# Altium footprint library My Library.PcbLib: 872 footprints (part 35 of 55)
Each footprint in its own frame and in the unit in brackets; x right, y up, seen from the top. Pads: shape width x height; smd on the part's side, far side on the other; paste and mask are expansions set on the pad; w line width, h text height; cw(c..) or ccw(c..) is an arc to the next point about the centre after c.
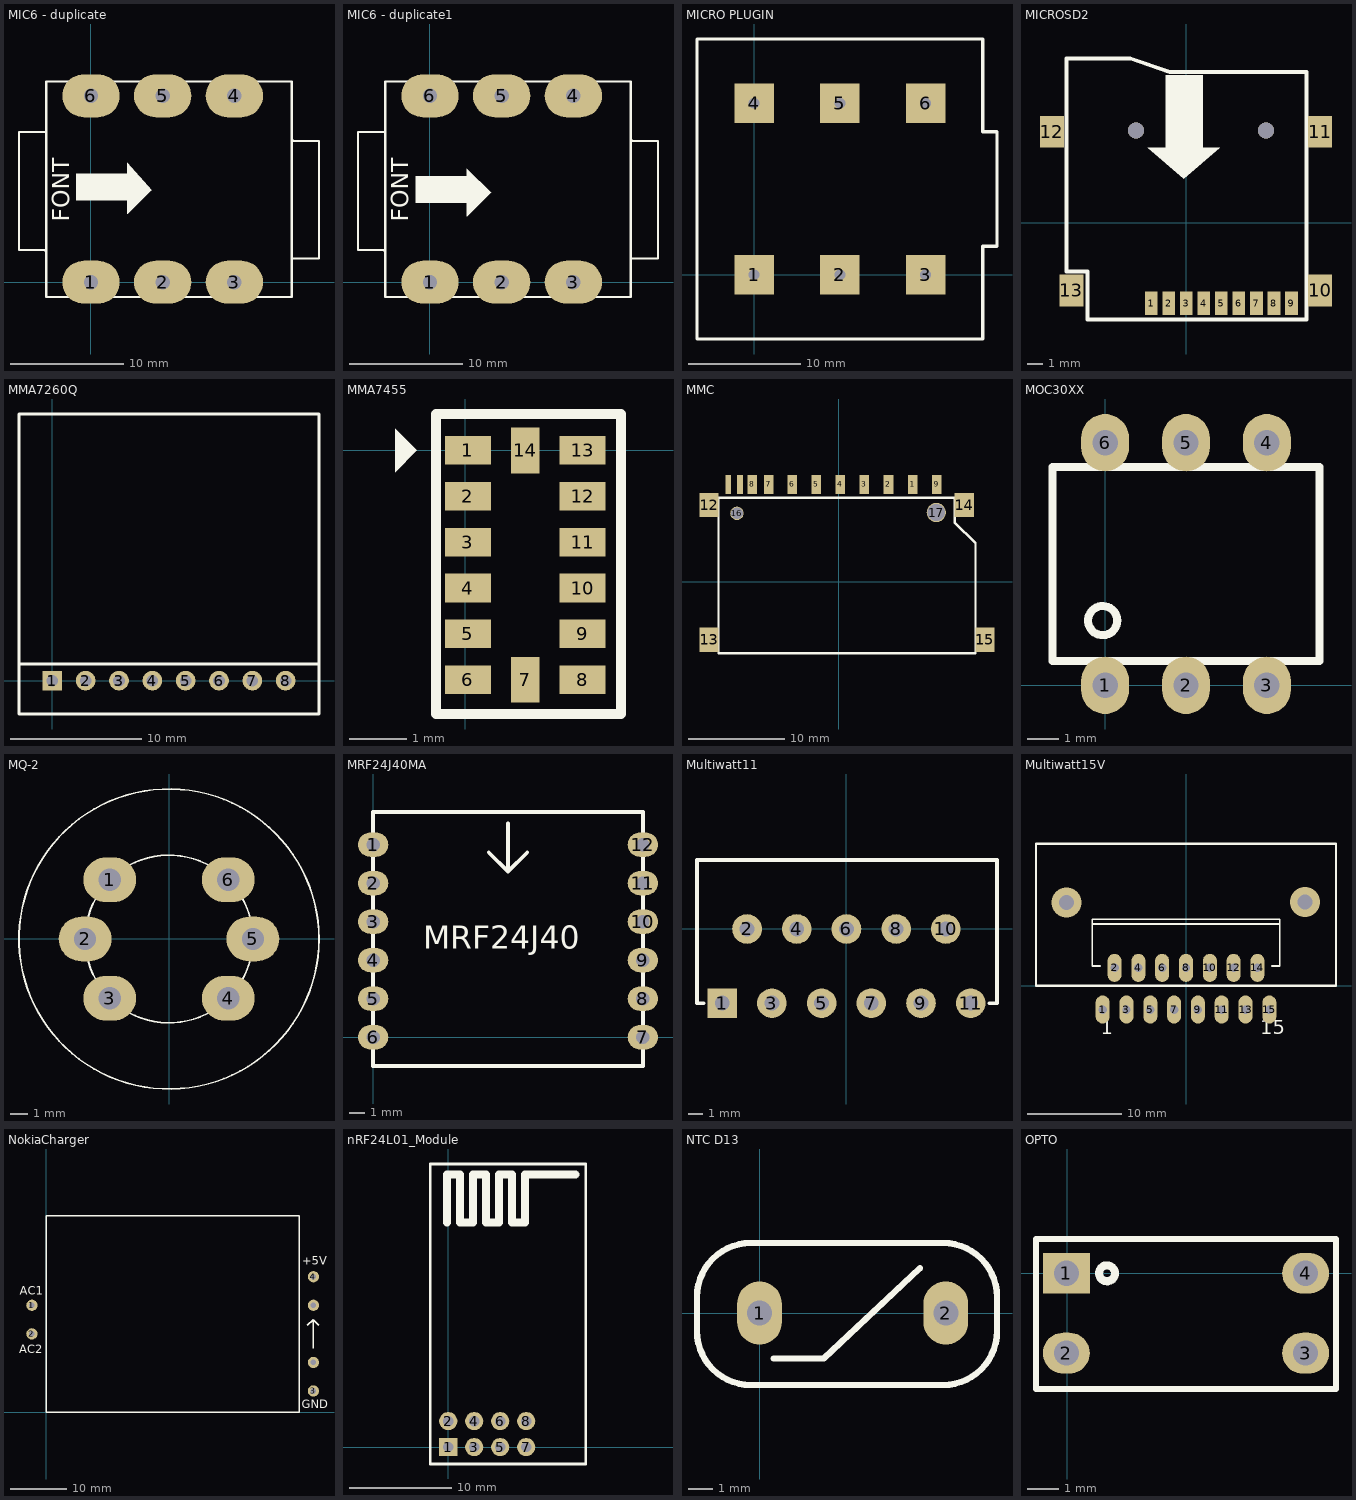
[diagram p34: the footprints below, top view; thin cyan lines are the x and y axes]

## MIC6 - duplicate [mm] "Jac Mic 6 pin to"
pads (6):
  oval 5.08x3.81 hole 1.27: 1(0,0) 2(6.35,0) 3(12.7,0) 4(12.7,16.51) 5(6.35,16.51) 6(0,16.51)
Top Overlay:
  region: -1.321,9.601 -1.321,7.264 3.251,7.264 3.226,7.29 3.226,6.071 3.251,6.071 5.334,8.153 5.359,8.153 3.226,10.592 3.226,9.601
  lines w0.178: -3.962,-1.295 -3.962,17.755 ; -3.962,2.261 -3.962,13.335 -4.013,13.284 -6.375,13.284 -6.375,2.845 -4.115,2.845 -3.962,2.692 ; -3.962,17.78 17.78,17.78 17.78,14.986 ; -3.937,-1.321 -3.912,-1.295 -3.886,-1.321 17.78,-1.321 17.78,2.083 ; 17.78,12.675 17.932,12.522 20.193,12.522 20.193,2.083 17.831,2.083 17.78,2.032 17.78,15.088
  text "FONT" at -1.905,5.334 h1.52

## MIC6 - duplicate1 [mm] "Jac Mic 6 pin to"
pads (6):
  oval 5.08x3.81 hole 1.27: 1(0,0) 2(6.35,0) 3(12.7,0) 4(12.7,16.51) 5(6.35,16.51) 6(0,16.51)
Top Overlay:
  region: -1.27,9.373 -1.27,7.036 3.302,7.036 3.277,7.061 3.277,5.842 3.302,5.842 5.385,7.925 5.41,7.925 3.277,10.058 3.277,9.373
  lines w0.178: -3.962,-1.295 -3.962,17.755 ; -3.962,2.261 -3.962,13.335 -4.013,13.284 -6.375,13.284 -6.375,2.845 -4.115,2.845 -3.962,2.692 ; -3.962,17.78 17.78,17.78 17.78,14.986 ; -3.937,-1.321 -3.912,-1.295 -3.886,-1.321 17.78,-1.321 17.78,2.083 ; 17.78,12.675 17.932,12.522 20.193,12.522 20.193,2.083 17.831,2.083 17.78,2.032 17.78,15.088
  text "FONT" at -1.905,5.334 h1.52

## MICRO PLUGIN [mil]
pads (6):
  rect 137.8x137.8 / inner round 62 / far side rect 137.8x137.8 hole 38: 1(0,0) 2(300,0) 3(600,0) 4(0,600) 5(300,600) 6(600,600)
Top Overlay:
  lines w11.82: -200,-225 800,-225 800,100 850,100 850,500 800,500 800,825 -200,825 -200,-225

## MICROSD2 [mm]
pads (13):
  rect 0.8x1.5 smd: 1(-2.184,-5.039) 2(-1.084,-5.039) 3(0.016,-5.039) 4(1.116,-5.039) 5(2.216,-5.039) 6(3.316,-5.039) 7(4.416,-5.039) 8(5.516,-5.039) 9(6.616,-5.039)
  rect 1.5x2 smd: 10(8.407,-4.235) 11(8.407,5.715) 12(-8.407,5.715) 13(-7.188,-4.235)
via -3.15,5.791 diameter 1 hole 1
via 5.004,5.791 diameter 1 hole 1
Top Overlay:
  region: 1.041,9.246 -1.27,9.246 -1.27,4.674 -1.245,4.699 -2.413,4.699 -0.127,2.769 2.108,4.699 1.041,4.699
  lines w0.254: -7.493,-3.035 -7.493,10.325 -3.52,10.325 -1.016,9.461 7.544,9.461 7.544,-6.071 -6.172,-6.071 -6.172,-3.035 -7.493,-3.035
3D body: height 1.85, standoff 0, extent -7.493,-4.559 7.544,10.325
3D body "User Library-microsd card.step": height 1.2, standoff 0.2, extent -5.43,-2.376 5.582,12.624

## MMA7260Q [mm] "Connector; Header; 8 Position"
pads (8):
  rect 1.5x1.5 hole 0.9: 1(0,0)
  round 1.5 hole 0.9: 2(2.54,0) 3(5.08,0) 4(7.62,0) 5(10.16,0) 6(12.7,0) 7(15.24,0) 8(17.78,0)
Top Overlay:
  lines w0.2: -2.54,1.27 20.32,1.27 ; -2.54,-2.54 -2.54,20.32 20.32,20.32 20.32,-2.54 -2.54,-2.54
3D body: height 2, standoff 1, extent 7.62,7.62 13.97,13.97
3D body: height 1, standoff 0, extent -2.54,-2.54 20.32,20.32

## MMA7455 [mm]
pads (14):
  rect 0.8x0.5 smd: 1(0.051,0) 2(0.051,-0.8) 3(0.051,-1.6) 4(0.051,-2.4) 5(0.051,-3.2) 6(0.051,-4) 8(2.051,-4) 9(2.051,-3.2) 10(2.051,-2.4) 11(2.051,-1.6) 12(2.051,-0.8) 13(2.051,0)
  rect 0.5x0.8 smd: 7(1.051,-4) 14(1.051,0)
Top Overlay:
  region: -1.219,0.381 -0.838,0 -1.219,-0.381
  lines w0.178: -0.508,-4.572 -0.508,0.635 2.718,0.635 2.718,-4.597 ; 2.718,-4.597 -0.508,-4.597 2.718,-4.597

## MMC [mm]
pads (17):
  rect 1x2 smd: 1(7.67,10.109) 2(5.17,10.109) 3(2.67,10.109) 4(0.17,10.109) 5(-2.33,10.109) 6(-4.83,10.109) 7(-7.255,10.109) 8(-8.955,10.109) 9(10.17,10.109)
  rect 0.6x2 smd: 10(-10.255,10.109) 11(-11.455,10.109)
  rect 2x2.5 smd: 12(-13.455,7.95) 13(-13.455,-6.02) 14(13.024,7.95) 15(15.183,-6.02)
  round 1.4 hole 1.2: 16(-10.555,7.109)
  round 2 hole 1.8: 17(10.135,7.188)
Top Overlay:
  lines w0.254: -12.471,-7.417 -12.471,8.712 12.04,8.712 12.04,6.172 14.199,4.013 14.199,-7.417 -12.471,-7.417
3D body "User Library-SD Kart.step": height 3, standoff -1, extent -13.436,-20.196 15.164,9.804

## MOC30XX [mm]
pads (6):
  oval 1.5x1.8 hole 0.8: 1(0,0) 2(2.54,0) 3(5.08,0) 4(5.08,7.62) 5(2.54,7.62) 6(0,7.62)
Top Overlay:
  circle w0.254: c-0.077,2.032 r0.458
  lines w0.254: -1.651,0.762 -1.651,6.858 6.731,6.858 6.731,0.762 -1.651,0.762
3D body "SW3DPS-DIP6-DEFAULT.step": height 4.41, standoff -3.18, extent -1.5,-0.19 6.58,7.81

## MQ-2 [mm] "MQ-2 GAS SENSOR"
height 20.32
pads (6):
  oval 3x2.54 hole 1.25: 1(-3.359,3.359) 2(-4.75,0) 3(-3.359,-3.359) 4(3.359,-3.359) 5(4.75,0) 6(3.359,3.359)
Top Overlay:
  circle w0.1: c0,0 r8.5
  circle w0.1: c0,0 r4.75
3D body: height 8.7, standoff 0.5, extent -4.762,-4.791 4.8,4.791
3D body: height 16.7, standoff 0.2, extent -4.713,-4.741 4.75,4.74
3D body: height 6.3, standoff 0.1, extent -8.433,-8.483 8.5,8.483
3D body: height 0.4, standoff -2.3, extent -3.855,2.86 -2.859,3.858
3D body: height 0.4, standoff -2.3, extent -5.258,-0.499 -4.262,0.499
3D body: height 0.4, standoff -2.3, extent -3.855,-3.858 -2.859,-2.86
3D body: height 0.4, standoff -2.3, extent 2.863,-3.858 3.859,-2.86
3D body: height 0.4, standoff -2.3, extent 4.254,-0.499 5.25,0.499
3D body: height 0.4, standoff -2.3, extent 2.863,2.86 3.859,3.858

## MRF24J40MA [mm] "Microchip Zigbee Module"
pads (12):
  oval 2x1.6 hole 0.9: 1(0,12.7) 2(0,10.16) 3(0,7.62) 4(0,5.08) 5(0,2.54) 6(0,0) 7(17.78,0) 8(17.78,2.54) 9(17.78,5.08) 10(17.78,7.62) 11(17.78,10.16) 12(17.78,12.7)
Top Overlay:
  lines w0.254: 0,8.255 0,-1.905 ; 7.62,12.192 8.89,10.922 ; 8.89,14.097 8.89,10.922 ; 10.16,12.192 8.89,10.922 ; 0,-1.905 17.78,-1.905 17.78,14.859 0,14.859 0,-1.905
  text "MRF24J40" at 3.302,5.842 h1.52

## Multiwatt11 [mil]
height 50
pads (11):
  rect 80x80 hole 40: 1(-335,-200)
  round 80 hole 40: 2(-268,0) 3(-201,-200) 4(-134,0) 5(-67,-200) 6(0,0) 7(67,-200) 8(134,0) 9(201,-200) 10(268,0) 11(335,-200)
Top Overlay:
  lines w10: -385,-200 -403,-200 -403,186 -7,186 406,186 406,-200 385,-200
3D body "User Library-Multiwatt11V.STEP": height 858.27, standoff -125.98, extent -396.64,-209.37 398.64,180

## Multiwatt15V [mm] "TO, Thru-Hole, Vertical, Heatsink Mounted; 15 Bent Staggered Leads; Pitch 1.27 mm"
height 21
pads (15):
  oval 1.5x3 hole 0.9: 1(-8.89,-2.54) 2(-7.62,1.905) 3(-6.35,-2.54) 4(-5.08,1.905) 5(-3.81,-2.54) 6(-2.54,1.905) 7(-1.27,-2.54) 8(0,1.905) 9(1.27,-2.54) 10(2.54,1.905) 11(3.81,-2.54) 12(5.08,1.905) 13(6.35,-2.54) 14(7.62,1.905) 15(8.89,-2.54)
via -12.763,8.903 diameter 3.2 hole 1.6
via 12.687,8.928 diameter 3.2 hole 1.6
Top Overlay:
  lines w0.2: -10,6.59 10,6.59 ; -9.144,2.09 -10,2.09 -10,7.09 10,7.09 10,2.09 9.144,2.09
  lines w0.254: -16,0 -16,15.136 16,15.136 16,0 -16,0
  text "15" at 7.94,-5.165 h1.5
  text "1" at -9.12,-5.165 h1.5
3D body "User Library-MULTIWAT T15.step": height 22.74, standoff -2.18, extent -9.8,-2.815 9.8,6.253

## NokiaCharger [mm]
pads (6):
  round 2 hole 1: 1(-2.54,19.05) 2(-2.54,13.97) 3(47.54,3.81) 4(47.54,24.13) TEMP(47.54,8.89) TEMP(47.54,19.05)
Top Overlay:
  lines w0.254: 46.482,15.494 47.498,16.51 ; 47.498,11.43 47.498,16.51 ; 48.514,15.494 47.498,16.51 ; 0,0 45,0 ; 0,0 45,0 ; 0,0 0,35 ; 0,35 45,35 ; 0,35 45,35 ; 45,0 45,35
  text "AC2" at -4.826,10.541 h1.52
  text "AC1" at -4.699,20.955 h1.52
  text "+5V" at 45.593,26.289 h1.52
  text "GND" at 45.466,0.762 h1.52

## nRF24L01_Module [mil]
pads (8):
  rect 70x70 hole 39.37 unplated: 1(0,0)
  round 70 hole 39.37 unplated: 2(0,100) 3(100,0) 4(100,100) 5(200,0) 6(200,100) 7(300,0) 8(300,100)
Top Overlay:
  lines w10: -70,-65 -70,1090 530,1090 530,-65 -70,-65
  lines w30: -5,865 -5,1050 45,1050 45,865 95,865 95,1050 145,1050 145,865 195,865 195,1050 245,1050 245,865 295,865 295,1050 490,1050
3D body "User Library-MY-NRF24L01P.STEP": height 587.57, standoff 0.5, extent -65,-60 525.55,1081.73

## NTC D13 [mm]
pads (2):
  oval 1.8x2.54 hole 1: 1(0,0) 2(7.493,0)
Top Overlay:
  lines w0.254: 0.559,-1.829 2.591,-1.829 6.452,1.803 ; -2.515,-0.728 ccw(c-0.347,-0.728) -1.88,-2.261 ccw(c-0.347,-0.728) -0.347,-2.896 7.382,-2.896 ccw(c7.382,-0.728) 8.915,-2.261 ccw(c7.382,-0.728) 9.55,-0.728 9.55,0.651 ccw(c7.382,0.651) 8.915,2.184 ccw(c7.382,0.651) 7.382,2.819 0.025,2.819 -0.347,2.819 ccw(c-0.347,0.651) -1.88,2.184 ccw(c-0.347,0.651) -2.515,0.651 -2.515,-0.728
3D body "SW3dPS-B57237.STEP": height 27.5, standoff -24.48, extent -3.715,-3.52 11.285,3.48

## OPTO [mm]
pads (4):
  rect 1.5x1.3 hole 0.8: 1(-0.025,0)
  oval 1.5x1.3 hole 0.8: 2(-0.025,-2.54) 3(7.595,-2.54) 4(7.595,0)
Top Overlay:
  circle w0.254: c1.27,0 r0.254
  lines w0.203: -0.991,-3.683 -0.991,1.092 8.56,1.092 8.56,-3.683 -0.991,-3.683
3D body "PC817.step": height 4.81, standoff -2.19, extent -0.13,-3.59 7.75,1